# Altium footprint library BMS_V2.1_Adv.PcbLib: 66 footprints (part 2 of 5)
Each footprint in its own frame and in the unit in brackets; x right, y up, seen from the top. Pads: shape width x height; smd on the part's side, far side on the other; paste and mask are expansions set on the pad; w line width, h text height; cw(c..) or ccw(c..) is an arc to the next point about the centre after c.
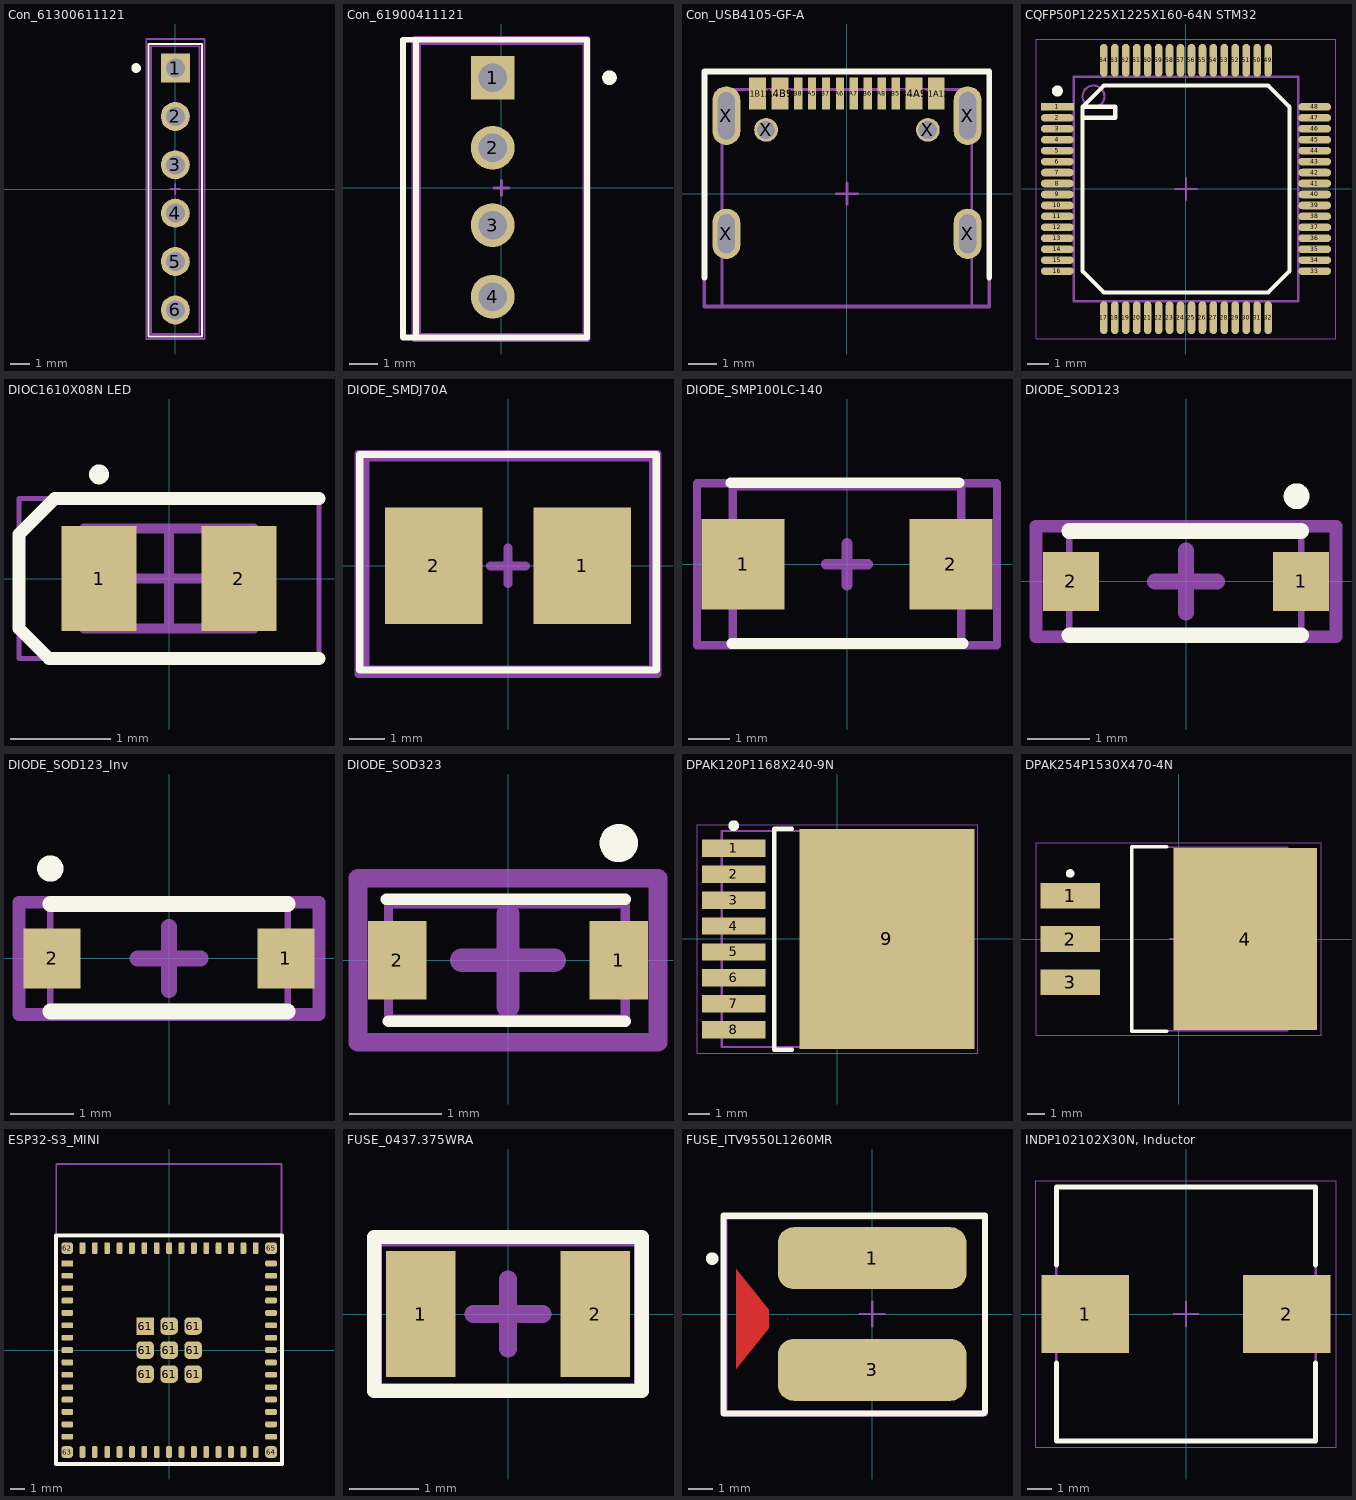
[diagram p1: the footprints below, top view; thin cyan lines are the x and y axes]

## Con_61300611121 [mil] "6 pos Header - 2.54mm Pitch"
height 454.33
pads (6):
  rect 60x60 hole 39.37: 1(0,250)
  round 60 hole 39.37: 2(0,150) 3(0,50) 4(0,-50) 5(0,-150) 6(0,-250)
Top Overlay:
  circle w10: c-81,250 r5
  lines w3.94: -55,-305 -55,300 55,300 55,-305 -55,-305
Mechanical 13:
  lines w3.94: -50,-300 -50,295 50,295 50,-300 -50,-300
  text ".Designator" at -65,-1 h27
Mechanical 15:
  lines w3.94: -10,0 10,0 ; 0,-10 0,10 ; -60,-310 -60,310 60,310 60,-310 -60,-310
3D body "61300611121.stp": height 317.04, standoff -137.29, extent -50,-300 50,300

## Con_61900411121 [mil] "4 pos Header - 2.54mm Pitch"
height 559.06
pads (4):
  rect 60x60 hole 39.37: 1(-12,151)
  round 60 hole 39.37: 2(-12,55) 3(-12.01,-51) 4(-12,-149)
Top Overlay:
  circle w10: c148,151 r5
  lines w8: -117,-205 -135,-205 -135,203 -117,203 ; -117,-205 -117,203 ; -117,-205 117,-205 117,203 -117,203 ; -117,-205 -117,203
Mechanical 13:
  lines w8: -114,-203 115,-203 115,200 -114,200 -114,-203
  text ".Designator" at -105,-6 h27
Mechanical 15:
  lines w3.94: -10,0 10,0 ; 0,-10 0,10
  lines w8: -119,-207 118,-207 118,204 -119,204 -119,-207
3D body "61900411121_Download_STP_61900411121_rev1.stp": height 453.26, standoff -133.36, extent -114.17,-200 114.17,200

## Con_USB4105-GF-A [mm] "USB Type C 2.0 Connector"
height 2.56
pads (20):
  rect 0.6x1.15 smd: A1B12(-3.2,3.581) A4B9(-2.4,3.581) B1A12(3.2,3.581) B4A9(2.4,3.581)
  rect 0.3x1.15 smd: A5(-1.25,3.581) A6(-0.25,3.581) A7(0.25,3.581) A8(1.25,3.581) B5(1.75,3.581) B6(0.75,3.581) B7(-0.75,3.581) B8(-1.75,3.581)
  oval 1x1.8 hole 0.6 slot 1.4 at 90 deg: X(-4.318,-1.437) X(4.322,-1.437)
  oval 1x2.1 hole 0.6 slot 1.7 at 90 deg: X(-4.318,2.794) X(4.322,2.794)
  round 0 on Drill Drawing: X(-3.937,3.302) X(4.191,2.921)
  round 0.85 hole 0.65: X(-2.896,2.286) X(2.896,2.286)
Top Overlay:
  lines w0.203: -5.1,-3 -5.1,4.375 5.1,4.375 5.1,-3
Mechanical 13:
  lines w0.1: -4.47,-4.039 -4.47,3.734 4.47,3.734 4.47,-4.039 -4.47,-4.039
  text ".Designator" at -2.794,-0.152 h0.69
Mechanical 15:
  lines w0.1: -0.381,0 0.381,0 ; 0,-0.381 0,0.381
  lines w0.127: -5.105,-4.039 5.1,-4.039 5.1,4.375 -5.105,4.375 -5.105,-4.039
3D body "USB4105-GF-A.step": height 3.32, standoff -1.09, extent -4.47,-3.997 4.47,3.713

## CQFP50P1225X1225X160-64N STM32 [mm] "CQFP, 64-Leads, Body 12.25x12.25mm, Pitch 0.50mm, IPC Medium Density"
height 1.6
pads (64):
  rect 1.5x0.35 smd paste+0 mask+0.102: 1(-5.875,3.75)
  oval 1.5x0.35 smd paste+0 mask+0.102: 2(-5.875,3.25) 3(-5.875,2.75) 4(-5.875,2.25) 5(-5.875,1.75) 6(-5.875,1.25) 7(-5.875,0.75) 8(-5.875,0.25) 9(-5.875,-0.25) 10(-5.875,-0.75) 11(-5.875,-1.25) 12(-5.875,-1.75) 13(-5.875,-2.25) 14(-5.875,-2.75) 15(-5.875,-3.25) 16(-5.875,-3.75) 33(5.875,-3.75) 34(5.875,-3.25) 35(5.875,-2.75) 36(5.875,-2.25) 37(5.875,-1.75) 38(5.875,-1.25) 39(5.875,-0.75) 40(5.875,-0.25) 41(5.875,0.25) 42(5.875,0.75) 43(5.875,1.25) 44(5.875,1.75) 45(5.875,2.25) 46(5.875,2.75) 47(5.875,3.25) 48(5.875,3.75)
  oval 0.35x1.5 smd paste+0 mask+0.102: 17(-3.75,-5.875) 18(-3.25,-5.875) 19(-2.75,-5.875) 20(-2.25,-5.875) 21(-1.75,-5.875) 22(-1.25,-5.875) 23(-0.75,-5.875) 24(-0.25,-5.875) 25(0.25,-5.875) 26(0.75,-5.875) 27(1.25,-5.875) 28(1.75,-5.875) 29(2.25,-5.875) 30(2.75,-5.875) 31(3.25,-5.875) 32(3.75,-5.875) 49(3.75,5.875) 50(3.25,5.875) 51(2.75,5.875) 52(2.25,5.875) 53(1.75,5.875) 54(1.25,5.875) 55(0.75,5.875) 56(0.25,5.875) 57(-0.25,5.875) 58(-0.75,5.875) 59(-1.25,5.875) 60(-1.75,5.875) 61(-2.25,5.875) 62(-2.75,5.875) 63(-3.25,5.875) 64(-3.75,5.875)
Top Overlay:
  circle w0.25: c-5.875,4.475 r0.125
  lines w0.2: -4.725,3.25 -3.225,3.25 -3.225,3.75 -4.725,3.75 ; -4.725,3.75 -4.725,-3.75 -3.75,-4.725 3.75,-4.725 4.725,-3.75 4.725,3.75 3.75,4.725 -3.75,4.725 -4.725,3.75
Mechanical 13:
  circle w0.1: c-4.225,4.225 r0.5
  lines w0.1: -5.125,-5.125 -5.125,5.125 5.125,5.125 5.125,-5.125 -5.125,-5.125
  text ".Designator" at -3.175,-0.254 h0.69
Mechanical 15:
  lines w0.05: -6.85,-6.85 -6.85,6.85 6.85,6.85 6.85,-6.85 -6.85,-6.85
  lines w0.1: -0.5,0 0.5,0 ; 0,-0.5 0,0.5
3D body "LQFP64-10x10mm.step": height 1.6, standoff 0, extent -5.997,-5.997 5.997,5.997

## DIOC1610X08N LED [mm] "Chip Diode, 2-Leads, Body 1.65x0.95mm, IPC Medium Density"
height 0.8
pads (2):
  rect 0.75x1.05 smd: 1(-0.7,0) 2(0.7,0)
Top Overlay:
  circle w0.1: c-0.7,1.041 r0.05
  lines w0.127: 1.5,-0.8 -1.2,-0.8 -1.5,-0.5 -1.5,0.443 -1.143,0.8 1.5,0.8
Mechanical 13:
  lines w0.1: -0.85,-0.5 0.85,-0.5 0.85,0.5 -0.85,0.5 -0.85,-0.5
  text ".Designator" at -1.143,-0.635 h0.69
Mechanical 15:
  lines w0.05: -1.5,-0.8 1.5,-0.8 1.5,0.8 -1.5,0.8 -1.5,-0.8
  lines w0.1: -0.5,0 0.5,0 ; 0,-0.5 0,0.5
3D body "150060RS75000 - LED.step": height 0.81, standoff 0.01, extent -0.8,-0.4 0.8,0.4

## DIODE_SMDJ70A [mm] "SMC J lead Diode"
height 2.62
pads (2):
  rect 2.75x3.3 smd: 1(2.1,0) 2(-2.1,0)
Top Overlay:
  lines w0.203: -4.191,-2.946 -4.191,3.15 4.191,3.15 4.191,-2.946 -4.191,-2.946
Mechanical 13:
  lines w0.203: -4.013,-2.921 -4.013,3.048 4.089,3.048 4.089,-2.921 -4.013,-2.921
  text ".Designator" at -2.667,-0.152 h0.69
Mechanical 15:
  lines w0.203: -4.242,-3.073 -4.242,3.175 4.242,3.175 4.242,-3.073 -4.242,-3.073
  lines w0.254: -0.5,0 0.5,0 ; 0,-0.5 0,0.5
3D body "SMDJ70A.STEP": height 2.63, standoff 0.01, extent -3.97,-2.953 3.97,2.953

## DIODE_SMP100LC-140 [mm] "SMP100LC-140"
height 2.65
pads (2):
  rect 2x2.18 smd: 1(-2.5,0) 2(2.5,0)
Top Overlay:
  lines w0.254: -2.794,1.956 2.692,1.956 ; -2.769,-1.905 2.794,-1.905
Mechanical 13:
  lines w0.203: -2.743,-1.88 -2.743,1.88 2.743,1.88 2.743,-1.88 -2.743,-1.88
  text ".Designator" at -2.032,-0.025 h0.69
Mechanical 15:
  lines w0.203: -3.607,-1.943 -3.607,1.943 3.607,1.943 3.607,-1.943 -3.607,-1.943
  lines w0.254: -0.5,0 0.5,0 ; 0,-0.5 0,0.5
3D body "SMP100LC-140.step": height 2.66, standoff 0.01, extent -2.675,-1.813 2.675,1.813

## DIODE_SOD123 [mm] "BAT46W, MMSZ4697T1G, MMSZ5246BQ-7-F, SBR80520LT1G"
height 1.2
pads (2):
  rect 0.9x0.95 smd: 1(1.85,0) 2(-1.85,0)
Top Overlay:
  circle w0.254: c1.778,1.372 r0.08
  lines w0.254: -1.88,-0.864 1.854,-0.864 ; -1.88,0.813 1.854,0.813
Mechanical 13:
  lines w0.1: -1.88,-0.838 1.854,-0.838 1.854,0.864 -1.88,0.864 -1.88,-0.838
  text ".Designator" at -1.651,-0.152 h0.69
Mechanical 15:
  lines w0.203: -2.413,-0.889 2.413,-0.889 2.413,0.889 -2.413,0.889 -2.413,-0.889
  lines w0.254: -0.5,0 0.5,0 ; 0,-0.5 0,0.5
3D body "MMSZ4697T1G.step": height 1.26, standoff -0.09, extent -1.84,-0.825 1.84,0.775

## DIODE_SOD123_Inv [mm] "MMSZ5227C-E3-08"
height 1.2
pads (2):
  rect 0.9x0.95 smd: 1(1.85,0) 2(-1.85,0)
Top Overlay:
  circle w0.254: c-1.88,1.422 r0.08
  lines w0.254: -1.88,-0.838 1.88,-0.838 ; -1.88,0.864 1.88,0.864
Mechanical 13:
  lines w0.1: -1.88,-0.762 -1.88,0.787 1.88,0.787 1.88,-0.762 -1.88,-0.762
  text ".Designator" at -1.651,-0.152 h0.69
Mechanical 15:
  lines w0.203: -2.375,-0.889 -2.375,0.889 2.375,0.889 2.375,-0.889 -2.375,-0.889
  lines w0.254: -0.5,0 0.5,0 ; 0,-0.5 0,0.5
3D body "MMSZ4697T1G.step": height 1.26, standoff -0.09, extent -1.84,-0.825 1.84,0.775

## DIODE_SOD323 [mm] "SBAS16HT1G,"
height 0.9
pads (2):
  rect 0.63x0.85 smd: 1(1.2,0) 2(-1.2,0)
Top Overlay:
  circle w0.254: c1.2,1.27 r0.08
  lines w0.127: -1.321,0.66 1.27,0.66 ; -1.295,-0.66 1.27,-0.66
Mechanical 13:
  lines w0.1: -1.295,-0.635 1.27,-0.635 1.27,0.61 -1.295,0.61 -1.295,-0.635
  text ".Designator" at -1.168,-0.279 h0.69
Mechanical 15:
  lines w0.203: -1.626,-0.889 1.626,-0.889 1.626,0.889 -1.626,0.889 -1.626,-0.889
  lines w0.254: -0.5,0 0.5,0 ; 0,-0.5 0,0.5
3D body "SBAS16HT1G.step": height 0.91, standoff -0.09, extent -1.25,-0.619 1.25,0.619

## DPAK120P1168X240-9N [mm] "TO, 9-Pads, Body 8.34x8.36mm (max), IPC Medium Density"
height 2.4
pads (9):
  rect 2.95x0.8 smd: 1(-4.8,4.2) 2(-4.8,3) 3(-4.8,1.8) 4(-4.8,0.6) 5(-4.8,-0.6) 6(-4.8,-1.8) 7(-4.8,-3) 8(-4.8,-4.2)
  rect 8.1x10.2 smd: 9(2.3,0)
Top Overlay:
  circle w0.25: c-4.8,5.25 r0.125
  lines w0.2: -2.1,-5.131 -2.925,-5.131 -2.925,5.111 -2.1,5.111
Mechanical 13:
  lines w0.1: -5.35,-5 -5.35,5 5.13,5 5.13,-5 -5.35,-5
  text ".Designator" at -1.905,-0.406 h0.69
Mechanical 15:
  lines w0.05: -6.5,-5.3 -6.5,5.3 6.5,5.3 6.5,-5.3 -6.5,-5.3
  lines w0.1: -0.5,0 0.5,0 ; 0,-0.5 0,0.5
3D body "NVBLS0D8N08XTXG.stp": height 2.3, standoff -0.01, extent -5.84,-4.956 5.84,4.956

## DPAK254P1530X470-4N [mm] "D2-PAK, 4-Pads, Body 7.68x8.74mm (max), IPC Medium Density"
height 4.7
pads (4):
  rect 3.5x1.5 smd: 1(-6.35,2.54) 2(-6.35,0) 3(-6.35,-2.54)
  rect 8.4x10.65 smd: 4(3.9,0)
Top Overlay:
  circle w0.25: c-6.35,3.84 r0.125
  lines w0.2: -0.7,-5.4 -2.75,-5.4 -2.75,5.4 -0.7,5.4
Mechanical 13:
  lines w0.1: -2.75,-5.375 -2.75,5.375 6.4,5.375 6.4,-5.375 -2.75,-5.375
  text ".Designator" at -2.413,-0.025 h0.69
Mechanical 15:
  lines w0.05: -8.35,-5.625 -8.35,5.625 8.35,5.625 8.35,-5.625 -8.35,-5.625
  lines w0.1: -0.5,0 0.5,0 ; 0,-0.5 0,0.5
3D body "DPAK254P1530X470-4N.step": height 4.8, standoff 0, extent -6.765,-5.375 8.535,5.375

## ESP32-S3_MINI [mm] "Multiprotocol Modules SMD module, ESP32-S3FN8, 8 MB SPI flash, PCB antenna"
pads (73):
  rect 0.8x0.4 smd: 1(-7,5.95)
  rrect50% 0.8x0.4 smd: 2(-6.985,5.1) 3(-6.985,4.25) 4(-6.985,3.4) 5(-6.985,2.55) 6(-6.985,1.7) 7(-6.985,0.85) 8(-6.985,0) 9(-6.985,-0.85) 10(-6.985,-1.7) 11(-6.985,-2.55) 12(-6.985,-3.4) 13(-6.985,-4.25) 14(-6.985,-5.1) 15(-6.985,-5.95) 31(7,-5.95) 32(7,-5.1) 33(7,-4.25) 34(7,-3.4) 35(7,-2.55) 36(7,-1.7) 37(7,-0.85) 38(7,0) 39(7,0.85) 40(7,1.7) 41(7,2.55) 42(7,3.4) 43(7,4.25) 44(7,5.1) 45(7,5.95)
  rrect50% 0.4x0.8 smd: 16(-5.95,-7) 17(-5.1,-7) 18(-4.25,-7) 19(-3.4,-7) 20(-2.55,-7) 21(-1.7,-7) 22(-0.85,-7) 23(0,-7) 24(0.85,-7) 25(1.7,-7) 26(2.55,-7) 27(3.4,-7) 28(4.25,-7) 29(5.1,-7) 30(5.95,-7) 46(5.95,7) 47(5.1,7) 48(4.25,7) 49(3.4,7) 50(2.55,7) 51(1.7,7) 52(0.85,7) 53(0,7) 54(-0.85,7) 55(-1.7,7) 56(-2.55,7) 57(-3.4,7) 58(-4.25,7) 59(-5.1,7) 60(-5.95,7)
  rrect50% 1.2x1.2 smd: 61(-1.65,-1.65) 61(-1.65,0) 61(0,-1.65) 61(0,0) 61(0,1.65) 61(1.65,-1.65) 61(1.65,0) 61(1.65,1.65)
  rect 1.2x1.2 smd: 61(-1.65,1.65)
  rrect50% 0.8x0.8 smd: 62(-7,7) 63(-7,-7) 64(7,-7) 65(7,7)
Top Overlay:
  lines w0.254: -7.76,-7.823 7.747,-7.823 7.747,7.874 -7.76,7.874 -7.76,-7.823
Mechanical 1:
  lines w0.127: -7.747,-7.772 7.722,-7.772 7.722,12.776 -7.747,12.776 -7.747,-7.772
Mechanical 13:
  lines w0.1: -7.713,-7.76 7.7,-7.76 7.7,7.747 -7.713,7.747 -7.713,-7.76
  text ".Designator" at -3.429,-3.708 h0.69
Mechanical 15:
  lines w0.254: -0.5,0 0.5,0 ; 0,-0.5 0,0.5
3D body "ESP32-S3-MINI-1-N8.step": height 2.56, standoff 0.01, extent -7.7,-7.725 7.7,12.775

## FUSE_0437.375WRA [mm] "0437.375WRA"
pads (2):
  rect 1x1.8 smd: 1(-1.25,0) 2(1.25,0)
Top Overlay:
  lines w0.203: -1.918,-1.105 -1.918,1.105 1.918,1.105 1.918,-1.105 -1.918,-1.105
Mechanical 13:
  lines w0.1: -1.854,-1.041 -1.854,1.016 1.854,1.016 1.854,-1.041 -1.854,-1.041
  text ".Designator" at -1.651,-0.025 h0.69
Mechanical 15:
  lines w0.127: -1.918,-1.105 -1.918,1.105 1.918,1.105 1.918,-1.105 -1.918,-1.105
  lines w0.254: -0.5,0 0.5,0 ; 0,-0.5 0,0.5

## FUSE_ITV9550L1260MR [mm] "ITV9550L1260MR"
height 2
pads (3):
  rrect50% 7.6x2.5 smd: 1(0,2.25) 3(0,-2.25)
  round 0.025 smd: 2(-3.429,-0.203)
Top Layer:
  region: -5.479,-2.203 -5.479,1.797 -4.179,0.172 -4.179,-0.578
Top Overlay:
  circle w0.254: c-6.452,2.235 r0.127
  lines w0.254: -5.994,-4.013 -5.994,3.962 4.547,3.962 4.547,-3.937 4.47,-4.013 -5.994,-4.013
Mechanical 13:
  text ".Designator" at -3.429,-0.025 h0.69
Mechanical 15:
  lines w0.1: -0.5,0 0.5,0 ; 0,-0.5 0,0.5
  lines w0.254: -5.969,-4.013 -5.969,3.937 4.547,3.937 4.547,-4.013 -5.969,-4.013

## INDP102102X30N, Inductor [mm] "Precision Wire Wound Inductor, 2-Leads, Body 10.25x10.15mm, IPC Medium Density"
height 3
pads (2):
  rect 3.55x3.15 smd: 1(-4.075,0) 2(4.075,0)
Top Overlay:
  lines w0.2: -5.25,-1.975 -5.25,-5.15 5.25,-5.15 5.25,-1.975 ; -5.25,1.975 -5.25,5.15 5.25,5.15 5.25,1.975
Mechanical 13:
  lines w0.1: -5.25,-5.15 5.25,-5.15 5.25,5.15 -5.25,5.15 -5.25,-5.15
  text ".Designator" at -3.302,-0.254 h0.69
Mechanical 15:
  lines w0.05: -6.075,-5.4 6.075,-5.4 6.075,5.4 -6.075,5.4 -6.075,-5.4
  lines w0.1: -0.5,0 0.5,0 ; 0,-0.5 0,0.5
3D body "7447713015 - Inductor.stp": height 2.66, standoff -0.19, extent -5,-5 5,5